# Altium footprint library General.PcbLib: 446 footprints (part 25 of 28)
Each footprint in its own frame and in the unit in brackets; x right, y up, seen from the top. Pads: shape width x height; smd on the part's side, far side on the other; paste and mask are expansions set on the pad; w line width, h text height; cw(c..) or ccw(c..) is an arc to the next point about the centre after c.
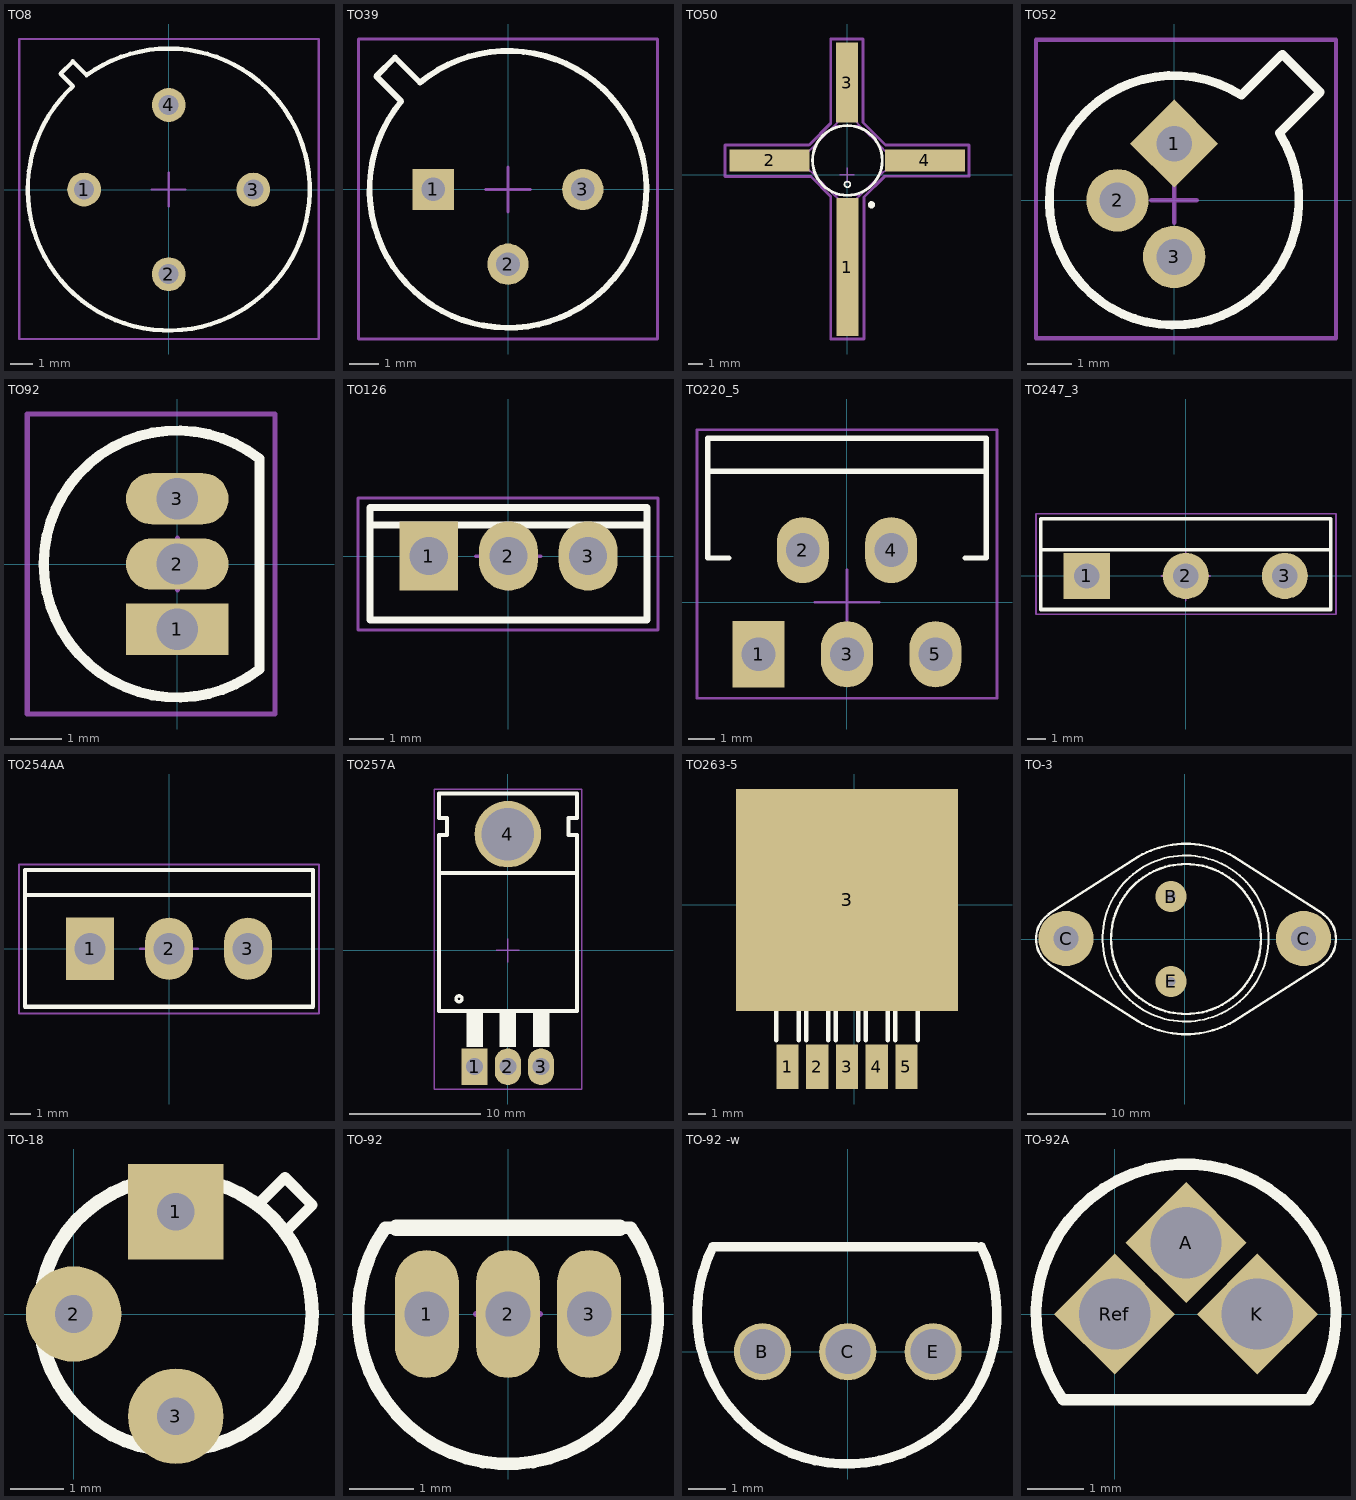
[diagram p24: the footprints below, top view; thin cyan lines are the x and y axes]

## TO8 [mil] "Can; 4 Leads; Pin Circle Dia. 7.62 mm; Lead Dia. 0.48 mm (max)"
height 270
pads (4):
  round 60 hole 35.43: 1(-150,0) 2(0,-150) 3(150,0) 4(0,150)
Top Overlay:
  lines w7.87: -145.83,203.06 cw(c0,0) -169.86,183.43 -191.78,205.35 -169.86,227.27 -145.74,203.15
Mechanical 13:
  lines w3.94: -145.83,203.06 cw(c0,0) -169.86,183.43 -191.78,205.35 -169.86,227.27 -145.74,203.15
Mechanical 15:
  lines w3.94: -30,0 0,0 ; 0,-30 0,0 ; 0,30 0,0 ; 30,0 0,0 ; -265,-265 -265,267 266,267 266,-265 -265,-265
3D body: height 270, standoff 0, extent -250.46,-250.44 250.02,250.35

## TO39 [mm] "Can; 3 Leads; Pin Circle Dia. 5.08 mm; Lead Dia. 0.48 mm (max)"
height 4.55
pads (3):
  rect 1.4x1.4 hole 0.8: 1(-2.54,0)
  round 1.4 hole 0.8: 2(0,-2.54) 3(2.54,0)
Top Overlay:
  lines w0.2: -4.475,3.838 -3.838,4.475 -2.99,3.626 cw(c0,0) -3.626,2.99 -4.475,3.838
Mechanical 13:
  lines w0.1: -4.475,3.838 -3.626,2.99 ccw(c0,0) -2.99,3.626 -3.838,4.475 -4.475,3.838
Mechanical 15:
  lines w0.1: -0.762,0 0,0 ; 0,-0.762 0,0 ; 0,0.762 0,0 ; 0.762,0 0,0 ; -5.08,-5.08 5.08,-5.08 5.08,5.105 -5.08,5.105 -5.08,-5.08
3D body: height 4.55, standoff 0, extent -4.702,-4.712 4.7,4.705

## TO50 [mm] "ERA, 4-Leads, Body 20.7x16.8mm,  Pitch 10.7mm"
height 2.5
pads (4):
  rect 1.5x9.5 smd: 1(0.013,-6.35)
  rect 5.5x1.5 smd: 2(-5.347,0.991) 4(5.347,0.991)
  rect 1.5x5.5 smd: 3(-0.013,6.35)
Top Overlay:
  circle w0.25: c1.669,-2.065 r0.125
  circle w0.1: c0.013,-0.66 r0.2
  circle w0.2: c0.013,0.991 r2.4
Mechanical 13:
  lines w0.1: -2.349,1.854 -2.349,0.076 ; -2.349,0.076 -0.876,-1.397 ; -2.349,0.076 -2.629,0.356 -7.07,0.356 -5.8,1.626 -2.654,1.626 -0.902,3.378 ; -0.902,3.378 0.876,3.378 ; -0.902,3.378 -0.66,3.619 -0.66,6.842 0.61,8.112 0.61,3.645 0.876,3.378 ; -0.876,-1.397 0.902,-1.397 ; -0.876,-1.397 -0.61,-1.664 -0.61,-10.13 0.635,-8.886 0.635,-1.664 0.902,-1.397 ; 0.876,3.378 2.375,1.88 ; 0.902,-1.397 2.4,0.102 2.426,0.102 ; 2.375,1.88 2.375,0.102 2.426,0.102 ; 2.375,1.88 2.629,1.626 7.426,1.626 7.426,0.356 2.68,0.356 2.426,0.102
Mechanical 15:
  lines w0.1: -0.5,0 0.5,0 ; 0,-0.5 0,0.5
  lines w0.2: -8.42,-0.127 -2.489,-0.127 -1.13,-1.486 -1.13,-2.083 -1.13,-11.303 1.156,-11.303 1.156,-1.537 2.591,-0.102 8.395,-0.102 8.395,2.057 2.629,2.057 1.079,3.607 1.079,9.347 -1.13,9.347 -1.13,3.543 -2.616,2.057 -8.42,2.057 -8.42,-0.127
3D body: height 2.5, standoff 0, extent -2.387,-1.409 2.412,3.39
3D body: height 1, standoff 0, extent 2.377,0.356 7.427,1.626
3D body: height 1, standoff 0, extent -0.61,-10.13 0.635,-1.397
3D body: height 1, standoff 0, extent -7.07,0.356 -2.349,1.626
3D body: height 1, standoff 0, extent -0.66,3.378 0.61,8.112
3D body: height 2.6, standoff 2.4, extent -0.187,-0.86 0.212,-0.461

## TO52 [mm] "Can; 3 Leads; Pin Circle Dia. 2.54 mm; Lead Dia. 0.48 mm (max)"
height 4.04
pads (3):
  rect 1.4x1.4 hole 0.8 rot 135: 1(0,1.27)
  round 1.4 hole 0.8: 2(-1.27,0) 3(0,-1.27)
Top Overlay:
  lines w0.2: 1.51,2.358 ccw(c0,0) 2.358,1.51 3.277,2.429 2.429,3.277 1.51,2.358
Mechanical 13:
  lines w0.1: 1.51,2.358 ccw(c0,0) 2.358,1.51 3.277,2.429 2.429,3.277 1.51,2.358
Mechanical 15:
  lines w0.1: -0.508,0 0,0 ; 0,-0.508 0,0 ; 0,0.508 0,0 ; 0.508,0 0,0 ; -3.099,-3.099 -3.099,3.607 3.632,3.607 3.632,-3.099 -3.099,-3.099
3D body: height 4.04, standoff 0, extent -2.813,-2.801 3.278,3.278

## TO92 [mm] "TO, Flat Index; 3 In-Line, Axial Leads; Body Dia. 5.1mm; Leads 0.48 x 0.48 mm (max)"
height 5.33
pads (3):
  rect 2x1 hole 0.8: 1(0,-1.27)
  oval 2x1 hole 0.8: 2(0,0) 3(0,1.27)
Top Overlay:
  lines w0.2: 1.601,-2.049 cw(c0,0) 1.601,2.049 1.6,-2.049
Mechanical 13:
  lines w0.1: 1.601,-2.049 cw(c0,0) 1.601,2.049 1.6,-2.049
Mechanical 15:
  lines w0.1: -0.508,0 0.508,0 ; 0.002,-0.509 0.002,0.507 ; -2.921,-2.921 1.905,-2.921 1.905,2.921 -2.921,2.921 -2.921,-2.921
3D body "SW3dPS-TO-92A.STEP": height 8, standoff -3, extent -2.355,-2.387 1.575,2.413

## TO126 [mm] "SIP with Mounting Hole; 3 Leads; Body 10.7 x 7.6 x 2.6 mm (typ); Pitch 2.2 mm"
height 13.4
pads (3):
  rect 1.7x2 hole 1.1: 1(-2.3,0)
  oval 1.7x2 hole 1.1: 2(0,0) 3(2.3,0)
Top Overlay:
  lines w0.2: -4,0.9 4,0.9 ; -4,-1.85 -4,1.4 4,1.4 4,-1.85 -4,-1.85
Mechanical 15:
  lines w0.1: -0.94,0 0,0 ; 0,-0.94 0,0 ; 0,0.94 0,0 ; 0.94,0 0,0 ; -4.343,-2.134 -4.343,1.676 4.318,1.676 4.318,-2.134 -4.343,-2.134
3D body: height 11, standoff 2.5, extent -3.999,0.901 3.999,1.399
3D body: height 11, standoff 2.5, extent -3.999,-1.849 3.999,0.899

## TO220_5 [mm] "TO, Thru-Hole, Vertical, Heatsink Mounted; 5 In-Line Leads; Pitch 1.7mm"
height 19
pads (5):
  rect 2x2.54 hole 1.3: 1(-3.4,-2)
  oval 2x2.54 hole 1.3: 2(-1.7,2) 3(0,-2) 4(1.7,2) 5(3.4,-2)
Top Overlay:
  lines w0.2: -5.35,5.03 5.35,5.03 ; -4.537,1.7 -5.35,1.7 -5.35,6.3 5.35,6.3 5.35,1.7 4.531,1.7
Mechanical 15:
  lines w0.1: -1.245,0 0,0 ; 0,-1.245 0,0 ; 0,1.245 0,0 ; 1.245,0 0,0 ; -5.766,-3.69 -5.766,6.625 5.766,6.625 5.766,-3.69 -5.766,-3.69
3D body "SW3dPS-TO220-5.STEP": height 21.59, standoff -2.4, extent -5.08,-2.119 5.08,6.121

## TO247_3 [mm] "SIP with Mounting Hole; 3 Leads; Body 20.6 x 15.6 x 4.7 mm (typ); Pitch 5.56 mm"
height 24.8
pads (3):
  rect 2.54x2.54 hole 1.4: 1(-5.46,0)
  round 2.54 hole 1.4: 2(0,0) 3(5.46,0)
Top Overlay:
  lines w0.2: -8,1.45 8,1.45 ; -8,-1.85 8,-1.85 8,3.15 -8,3.15 -8,-1.85
Mechanical 13:
  lines w0.1: -8,1.45 8,1.45 ; -8,-1.85 -8,3.15 8,3.15 8,-1.85 -8,-1.85
Mechanical 15:
  lines w0.1: 0,-1.346 0,0 ; 0,1.346 0,0 ; 1.346,0 0,0 ; -1.346,0 0,0 ; -1.346,0 -1.346,0 ; -8.255,-2.108 8.28,-2.108 8.28,3.429 -8.255,3.429 -8.255,-2.108
3D body: height 21, standoff 6, extent -7.999,1.451 7.999,3.149
3D body: height 21.5, standoff 5, extent -7.999,-1.849 7.999,3.15

## TO254AA [mm] "TO, Thru-Hole, Vertical, Heatsink Mounted; 3 In-Line Leads; Pitch 3.81 mm"
height 20.3
pads (3):
  rect 2.3x3 hole 1.5: 1(-3.81,0)
  oval 2.3x3 hole 1.5: 2(0,0) 3(3.81,0)
Top Overlay:
  lines w0.2: -6.95,2.6 6.95,2.6 ; -6.95,-2.8 -6.95,3.8 6.95,3.8 6.95,-2.8 -6.95,-2.8
Mechanical 15:
  lines w0.1: -1.397,0 0,0 ; 0,-1.397 0,0 ; 0,1.397 0,0 ; 1.397,0 0,0 ; -7.239,-3.124 -7.239,4.064 7.239,4.064 7.239,-3.124 -7.239,-3.124
3D body: height 20.15, standoff 13.7, extent -6.949,2.601 6.949,3.799
3D body: height 13.7, standoff 1, extent -6.949,-2.799 6.949,3.759

## TO257A [mm] "TO, Thru-Hole,Horizantal; 3 In-Line Leads; Pitch 2.54 mm"
height 0.114
pads (4):
  rect 2x2.794 hole 1.3: 1(-2.54,-8.89)
  oval 2x2.794 hole 1.3: 2(0,-8.89) 3(2.54,-8.89)
  round 5.08 hole 4: 4(0,8.89)
Top Overlay:
  circle w0.254: c-3.734,-3.697 r0.227
  region: 0.635,-4.623 -0.635,-4.623 -0.635,-7.366 0.635,-7.366
  region: -1.905,-4.623 -3.175,-4.623 -3.175,-7.366 -1.905,-7.366
  region: 3.175,-4.623 1.905,-4.623 1.905,-7.391 3.175,-7.391
  lines w0.305: -5.271,5.918 5.08,5.918 ; -5.271,-4.623 5.271,-4.623 5.271,8.839 4.635,8.839 4.635,10.109 5.271,10.109 5.271,12.014 -5.271,12.014 -5.271,10.109 -4.635,10.109 -4.635,8.839 -5.271,8.839 -5.271,-4.623
Mechanical 13:
  lines w0.1: -5.271,5.918 5.271,5.918 ; -5.271,-4.623 -5.271,8.839 -4.635,8.839 -4.635,10.109 -5.271,10.109 -5.271,12.014 5.271,12.014 5.271,10.109 4.635,10.109 4.635,8.839 5.271,8.839 5.271,-4.623 -5.271,-4.623
Mechanical 15:
  lines w0.1: -0.889,0 0,0 ; 0,-0.889 0,0 ; 0,0.889 0,0 ; 0.889,0 0,0 ; -5.639,-10.592 -5.639,12.344 5.664,12.344 5.664,-10.592 -5.639,-10.592
3D body: height 5, standoff 4.8, extent -3.96,-3.923 -3.507,-3.47
3D body: height 4.9, standoff 0, extent -5.27,-4.622 5.27,5.918
3D body: height 1, standoff 0, extent -5.27,5.919 5.27,12.014

## TO263-5 [mm]
pads (6):
  rect 1.27x2.54 smd: 1(-3.818,-9.27) 2(-2.116,-9.27) 3(-0.414,-9.27) 4(1.287,-9.27) 5(2.989,-9.27)
  rect 12.7x12.7 smd: 3(-0.414,0.28)
Top Overlay:
  lines w0.254: -4.453,-7.746 -4.453,-5.866 ; -3.183,-7.746 -3.183,-5.866 ; -2.751,-7.746 -2.751,-5.866 ; -1.481,-7.746 -1.481,-5.866 ; -1.049,-7.746 -1.049,-5.866 ; 0.221,-7.746 0.221,-5.866 ; 0.652,-7.746 0.652,-5.866 ; 1.922,-7.746 1.922,-5.866 ; 2.354,-7.746 2.354,-5.866 ; 3.624,-7.746 3.624,-5.866 ; -5.812,-5.866 4.983,-5.866 ; -5.812,-5.866 -5.812,4.548 ; -5.812,-5.866 -5.406,-5.46 ; -5.812,4.548 -5.812,5.36 -3.818,5.97 2.989,5.97 4.983,5.36 4.983,4.548 ; -5.812,4.548 -5.406,3.938 ; -5.812,4.548 4.983,4.548 ; -5.406,-5.46 4.577,-5.46 ; -5.406,-5.46 -5.406,3.938 ; -5.406,3.938 4.577,3.938 ; 4.577,-5.46 4.577,3.938 ; 4.577,-5.46 4.983,-5.866 ; 4.577,3.938 4.983,4.548 ; 4.983,-5.866 4.983,4.548
  text "1" at -4.074,-4.932 h0.89
  text "5" at 2.733,-4.932 h0.89
3D body "TO263-5S.STEP": height 4.81, standoff 0.01, extent -5.436,-10.045 4.564,5.625

## TO-3 [mm]
pads (4):
  round 4 hole 1.2: B(-1.746,5.397) E(-1.746,-5.397)
  round 7 hole 3.2: C(-15.081,0.064) C(15.081,0.064)
Top Overlay:
  circle w0.254: c0.108,0.064 r10.541
  circle w0.254: c-15.081,0.064 r2.413
  circle w0.305: c0.159,0 r9.525
  circle w0.254: c15.081,0.064 r2.413
  lines w0.305: -17.304,-3.175 -5.874,-10.477 ; -17.304,3.175 -5.874,10.477 ; -17.267,-3.121 cw(c-15.081,0) -18.891,0 cw(c-15.081,0) -17.267,3.121 ; -5.886,-10.47 ccw(c0.159,0) 0.159,-12.09 ccw(c0.159,0) 6.204,-10.47 ; -5.886,10.47 cw(c0.159,0) 0.159,12.09 cw(c0.159,0) 6.204,10.47 ; 6.191,-10.477 17.621,-3.175 ; 6.191,10.477 17.621,3.175 ; 17.584,-3.121 ccw(c15.399,0) 19.209,0 ccw(c15.399,0) 17.584,3.121 ; -16.034,-0.318 -16.034,0.318 -15.399,0.318 -15.399,0.953 -14.764,0.953 -14.764,0.318 -14.129,0.318 -14.129,-0.318 -14.764,-0.318 -14.764,-0.953 -15.399,-0.953 -15.399,-0.318 -16.034,-0.318 ; 14.129,-0.318 14.129,0.318 14.764,0.318 14.764,0.953 15.399,0.953 15.399,0.318 16.034,0.318 16.034,-0.318 15.399,-0.318 15.399,-0.953 14.764,-0.953 14.764,-0.318 14.129,-0.318

## TO-18 [mil]
pads (3):
  rect 70x70 hole 27.56: 1(75,75)
  round 70 hole 27.56: 2(0,0) 3(75,-75)
Top Overlay:
  circle w10: c75,0 r100
  lines w8: 135,80 155,100 175,80 155,60
3D body "TO-18.STEP": height 205.33, standoff 0.6, extent -44.85,-119.25 198.59,122.14

## TO-92 [mm] "TO, Flat Index; 3 In-Line, Axial Leads; Body Dia. 4.6mm; Leads 0.41 x 0.39 mm (max)"
height 4.7
pads (3):
  oval 1x2 hole 0.7: 1(-1.27,0) 2(0,0) 3(1.27,0)
Top Overlay:
  lines w0.2: -1.75,1.35 -1.92,1.35 ccw(c0,0) 1.92,1.35 1.75,1.35
  lines w0.254: 1.75,1.35 -1.75,1.35 ; -1.75,1.35 -1.75,1.35
Mechanical 15:
  lines w0.1: -0.5,0 0.5,0 ; 0,-0.5 0,0.5
3D body "User Library-TO-92-4.STEP": height 0.2, standoff -9.83, extent -2.852,-2.655 2.888,1.53

## TO-92 -w [mil] "npn transistoor"
pads (3):
  round 60 hole 47.24: B(-89.61,0) C(0,0) E(89.61,0)
Top Overlay:
  lines w10: -141.71,110 ccw(c-0.85,39.57) 140,110 ; -140.59,110 135,110
3D body "User Library-TO-92C.step": height 314.96, standoff -118.98, extent -109.74,-95 109.74,59.72

## TO-92A [mil]
pads (3):
  rect 60x60 hole 50 rot 45: A(50,50) K(100,0) Ref(0,0)
Top Overlay:
  lines w7.87: -36.27,-59.85 cw(c50,0) 136.22,-59.92 ; -36,-60 136,-60